# Altium footprint library AltiumLibrary.PcbLib: 129 footprints (part 6 of 9)
Each footprint in its own frame and in the unit in brackets; x right, y up, seen from the top. Pads: shape width x height; smd on the part's side, far side on the other; paste and mask are expansions set on the pad; w line width, h text height; cw(c..) or ccw(c..) is an arc to the next point about the centre after c.
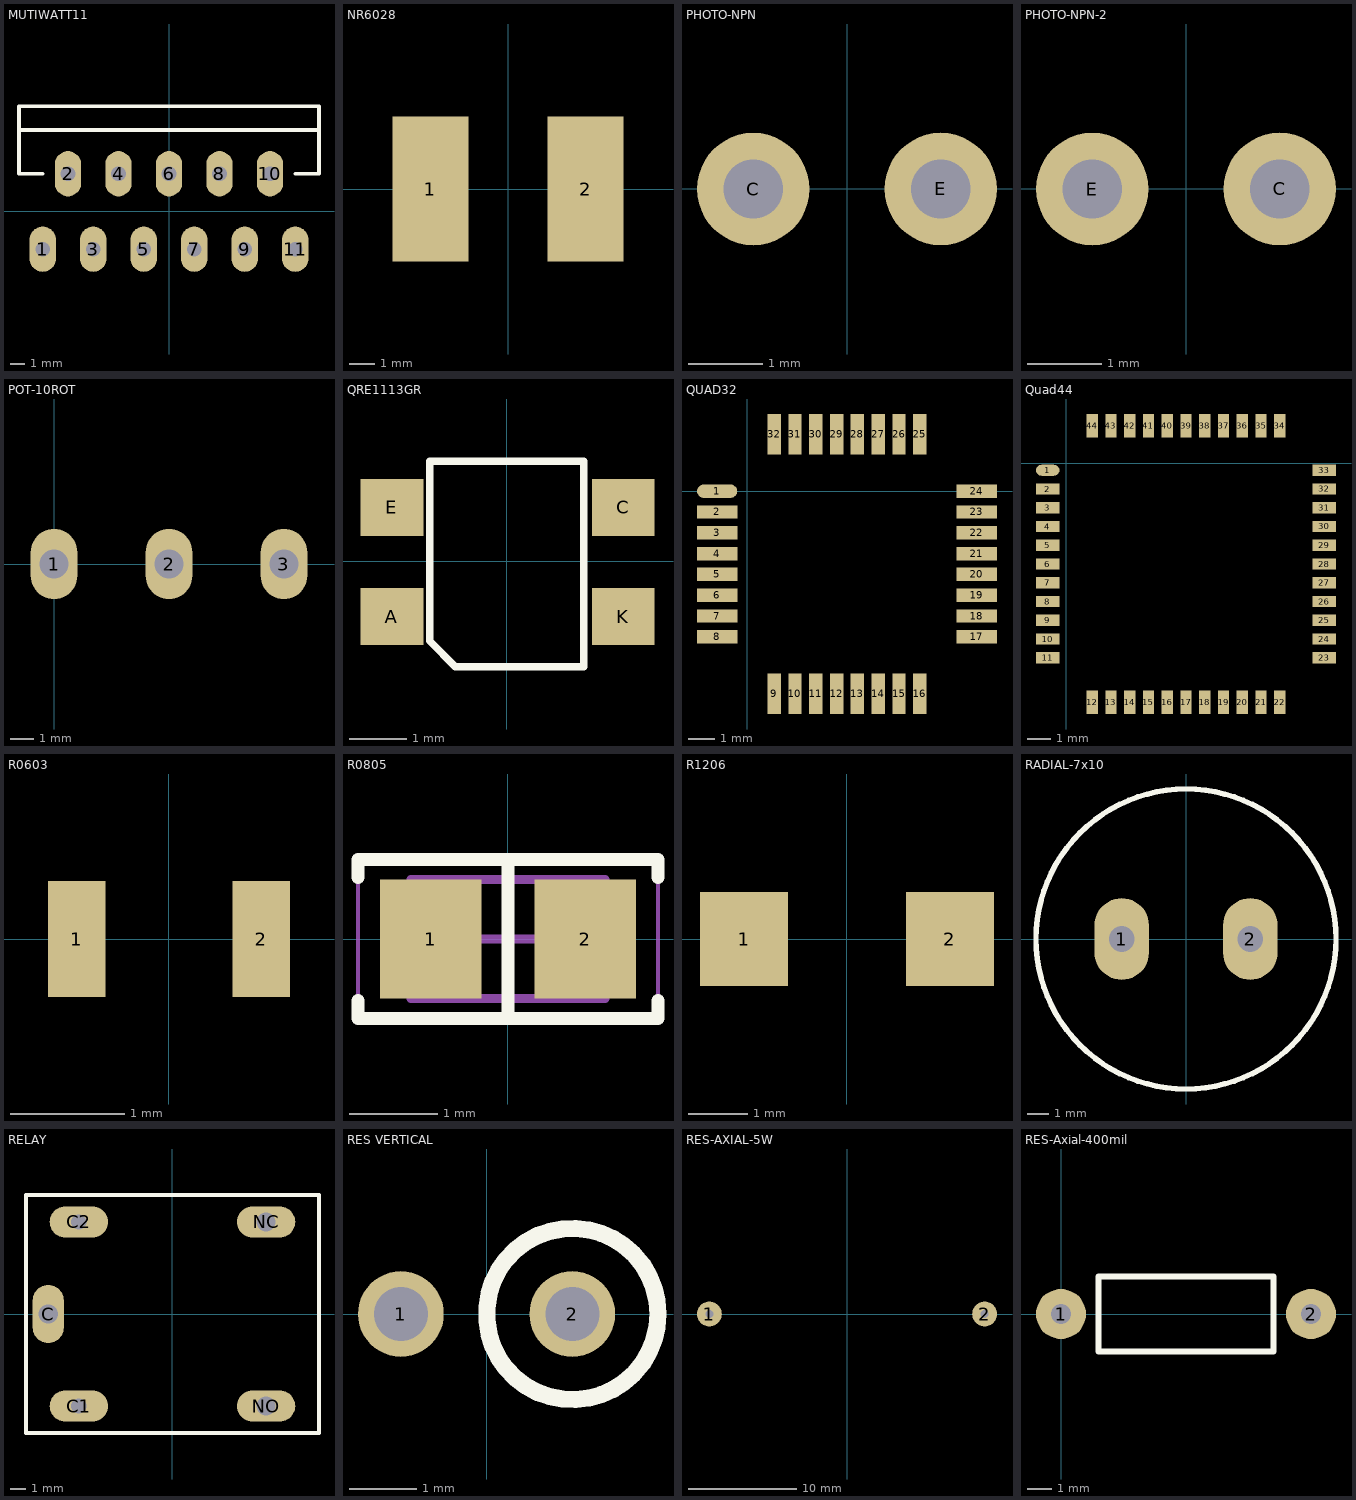
[diagram p5: the footprints below, top view; thin cyan lines are the x and y axes]

## MUTIWATT11 [mil]
pads (11):
  oval 70x120 hole 39.37: 1(-334.65,-100) 2(-267.72,100) 3(-200.79,-100) 4(-133.86,100) 5(-66.93,-100) 6(0,100) 7(66.93,-100) 8(133.86,100) 9(200.79,-100) 10(267.72,100) 11(334.65,-100)
Top Overlay:
  lines w10: -397.64,216.14 397.64,216.14 ; -334.65,100 -397.64,100 -397.64,279.13 397.64,279.13 397.64,100 334.65,100
3D body "User Library-Multiwatt11V.step": height 858.27, standoff -125.98, extent -397.64,-113.78 397.64,275.59

## NR6028 [mm]
pads (2):
  rect 3x5.7 smd: 1(-3.05,0) 2(3.05,0)
3D body "IND_TAIYO_NR6028.step": height 2.79, standoff 0, extent -3.099,-3.101 3.099,3.101

## PHOTO-NPN [mil]
pads (2):
  round 60 hole 31.5: C(-50,0) E(50,0)
3D body "LED 3mm, Red, Thru-hole, Right Angle PCB 1.stp": height 154.51, standoff -125.98, extent -75.78,-9.84 64.77,287.4

## PHOTO-NPN-2 [mil]
pads (2):
  round 60 hole 31.5: C(50,0) E(-50,0)
3D body "LED 3mm, Red, Thru-hole, Right Angle PCB 2.stp": height 154.51, standoff -125.98, extent -64.77,-8.59 75.79,288.66

## POT-10ROT [mil]
pads (3):
  oval 80x120 hole 49.21: 1(0,0) 2(196.85,0) 3(393.7,0)
3D body "B10K potentiometer 10K.stp": height 828.74, standoff -137.8, extent -137.59,-780.71 535.6,203.54

## QRE1113GR [mm]
pads (4):
  rect 1.1x1 smd: A(-2.01,-0.97) C(2.04,0.94) E(-2.01,0.94) K(2.04,-0.97)
Top Overlay:
  lines w0.127: -1.35,-1.4 -1.35,1.75 1.35,1.75 1.35,-1.85 -0.9,-1.85 -1.35,-1.4
Top Paste:
  region: -2.601,1.5 -1.4,1.5 -1.4,0.4 -2.601,0.4
  region: -2.605,-0.4 -1.4,-0.4 -1.4,-1.503 -2.605,-1.503
  region: 1.453,-0.4 2.65,-0.4 2.65,-1.503 1.453,-1.503
  region: 1.404,1.5 2.65,1.5 2.65,0.401 1.404,0.401
3D body "User Library-QRE1113GR.step": height 1.83, standoff -0.02, extent -2.4,-1.8 2.4,1.8

## QUAD32 [mil]
pads (32):
  oval 60x20 smd: 1(-45,0)
  rect 60x20 smd: 2(-45,-31) 3(-45,-62) 4(-45,-93) 5(-45,-124) 6(-45,-155) 7(-45,-186) 8(-45,-217) 17(342,-217) 18(342,-186) 19(342,-155) 20(342,-124) 21(342,-93) 22(342,-62) 23(342,-31) 24(342,0)
  rect 20x60 smd: 9(40,-302) 10(71,-302) 11(102,-302) 12(133,-302) 13(164,-302) 14(195,-302) 15(226,-302) 16(257,-302) 25(257,85) 26(226,85) 27(195,85) 28(164,85) 29(133,85) 30(102,85) 31(71,85) 32(40,85)
3D body "User Library-PTQFPK32.step": height 68, standoff 5, extent -32,-289 328,71

## Quad44 [mm]
pads (44):
  oval 1x0.47 smd: 1(-0.8,-0.3)
  rect 1x0.47 smd: 2(-0.8,-1.1) 3(-0.8,-1.9) 4(-0.8,-2.7) 5(-0.8,-3.5) 6(-0.8,-4.3) 7(-0.8,-5.1) 8(-0.8,-5.9) 9(-0.8,-6.7) 10(-0.8,-7.5) 11(-0.8,-8.3) 23(11,-8.3) 24(11,-7.5) 25(11,-6.7) 26(11,-5.9) 27(11,-5.1) 28(11,-4.3) 29(11,-3.5) 30(11,-2.7) 31(11,-1.9) 32(11,-1.1) 33(11,-0.3)
  rect 0.47x1 smd: 12(1.1,-10.2) 13(1.9,-10.2) 14(2.7,-10.2) 15(3.5,-10.2) 16(4.3,-10.2) 17(5.1,-10.2) 18(5.9,-10.2) 19(6.7,-10.2) 20(7.5,-10.2) 21(8.3,-10.2) 22(9.1,-10.2) 34(9.1,1.6) 35(8.3,1.6) 36(7.5,1.6) 37(6.7,1.6) 38(5.9,1.6) 39(5.1,1.6) 40(4.3,1.6) 41(3.5,1.6) 42(2.7,1.6) 43(1.9,1.6) 44(1.1,1.6)
3D body "User Library-44 pin tqfp ic package.step": height 1.2, standoff 0.09, extent -0.9,-10.3 11.1,1.7

## R0603 [mil]
pads (2):
  rect 20x40 smd: 1(-31.89,0) 2(31.89,0)
3D body "User Library-0603 SMD Resistor.step": height 11.89, standoff 0, extent -31.49,-15.74 31.5,15.75

## R0805 [mm] "Chip"
height 0.7
pads (2):
  rect 1.15x1.35 smd: 1(-0.875,0) 2(0.875,0)
Top Overlay:
  lines w0.15: -1.7,-0.7 -1.7,-0.9 1.7,-0.9 1.7,-0.7 ; -1.7,0.7 -1.7,0.9 1.7,0.9 1.7,0.7 ; 0,-0.9 0,0.9
Mechanical 13:
  lines w0.1: -1.1,-0.675 -1.1,0.675 1.1,0.675 1.1,-0.675 -1.1,-0.675
Mechanical 15:
  lines w0.05: -1.7,-0.95 -1.7,0.95 1.7,0.95 1.7,-0.95 -1.7,-0.95
  lines w0.1: -0.5,0 0.5,0 ; 0,-0.5 0,0.5
3D body "0805 resistor.STEP": height 0.6, standoff 0, extent -0.95,-0.625 1.05,0.625

## R1206 [mm]
pads (2):
  rect 1.5x1.6 smd: 1(-1.75,0) 2(1.75,0)
3D body "User Library-SMD RESISTOR-1.step": height 0.68, standoff 0.08, extent -1.6,-0.762 1.6,0.838

## RADIAL-7x10 [mm]
pads (2):
  oval 2.54x3.81 hole 1.2 unplated: 1(-3,0) 2(3,0)
Top Overlay:
  circle w0.254: c0,0 r7
3D body "mps_mag_1700_thd_a.STEP": height 1169.8, standoff 1124.75, extent 256.398,-613.814 262.698,-607.514
3D body "mps_mag_1700_thd_a.STEP": height 1169.8, standoff 1124.75, extent 256.398,-613.814 262.698,-607.514
3D body "mps_mag_1700_thd_a.STEP": height 1169.8, standoff 1124.75, extent 260.398,-619.814 266.698,-613.514
3D body "mps_mag_1700_thd_a.STEP": height 1169.8, standoff 1124.75, extent 256.398,-613.814 262.698,-607.514
3D body "mps_mag_1700_thd_a.STEP": height 1169.8, standoff 1124.75, extent 259.398,-616.814 265.698,-610.514
3D body "mps_mag_1700_thd_a.STEP": height 1169.8, standoff 1124.75, extent 256.398,-613.814 262.698,-607.514
3D body "mps_mag_1700_thd_a.STEP": height 1169.8, standoff 1124.75, extent 256.398,-613.814 262.698,-607.514
3D body "mps_mag_1700_thd_a.STEP": height 1169.8, standoff 1124.75, extent 260.398,-621.814 266.698,-615.514
3D body "mps_mag_1700_thd_a.STEP": height 1169.8, standoff 1124.75, extent 258.398,-622.814 264.698,-616.514
3D body "mps_mag_1700_thd_a.STEP": height 1169.8, standoff 1124.75, extent 258.398,-622.814 264.698,-616.514
3D body "mps_mag_1700_thd_a.STEP": height 1169.8, standoff 1124.75, extent 258.398,-622.814 264.698,-616.514
3D body "mps_mag_1700_thd_a.STEP": height 1169.8, standoff 1124.75, extent 258.398,-622.814 264.698,-616.514
3D body "mps_mag_1700_thd_a.STEP": height 1169.8, standoff 1124.75, extent 248.398,-607.814 254.698,-601.514
3D body "mps_mag_1700_thd_a.sldprt": height 1169.8, standoff 1169.75, extent 257.753,-613.02 261.355,-610.272
3D body "mps_mag_1700_thd_a.sldprt": height 1169.8, standoff 1169.75, extent 258.753,-611.02 262.355,-608.272
3D body: height 10, standoff 0, extent -7,-6.998 7,6.998

## RELAY [mm]
pads (5):
  oval 2.032x3.81 hole 1.25 unplated: C(-8.1,0)
  oval 3.81x2.032 hole 1 unplated: C1(-6.1,-6) C2(-6.1,6)
  oval 3.81x2.032 hole 1.25 unplated: NC(6.1,6) NO(6.1,-6)
Top Overlay:
  lines w0.254: -9.55,-7.75 9.55,-7.75 9.55,7.75 -9.55,7.75 -9.55,-7.75
3D body "User Library-relay_songle.STEP": height 15.6, standoff -4.7, extent -9.493,-7.862 9.607,7.638

## RES VERTICAL [mm]
pads (2):
  round 1.27 hole 0.8: 1(-1.27,0) 2(1.27,0)
Top Overlay:
  circle w0.254: c1.27,0 r1.27
3D body "User Library-Res_Stand.step": height 6.79, standoff -1.96, extent -1.52,-0.921 2.192,0.92

## RES-AXIAL-5W [mil]
pads (2):
  round 90 hole 30: 1(-500,0) 2(500,0)
3D body "User Library-Resistor 5W Length 22mm, pitch 1in.step": height 357.17, standoff -211.32, extent -515.74,-187 515.75,187.01

## RES-Axial-400mil [mil]
pads (2):
  round 80 hole 31.5: 1(0,0) 2(400,0)
Top Overlay:
  lines w10: 60,-60 60,0 60,60 340,60 340,-60 60,-60
3D body "SW3dPS-resistor - fixed.STEP": height 94, standoff -110, extent -12,-44 410,44